# Altium footprint library Rez-Axial Pot.PcbLib: 113 footprints (part 7 of 8)
Each footprint in its own frame and in the unit in brackets; x right, y up, seen from the top. Pads: shape width x height; smd on the part's side, far side on the other; paste and mask are expansions set on the pad; w line width, h text height; cw(c..) or ccw(c..) is an arc to the next point about the centre after c.
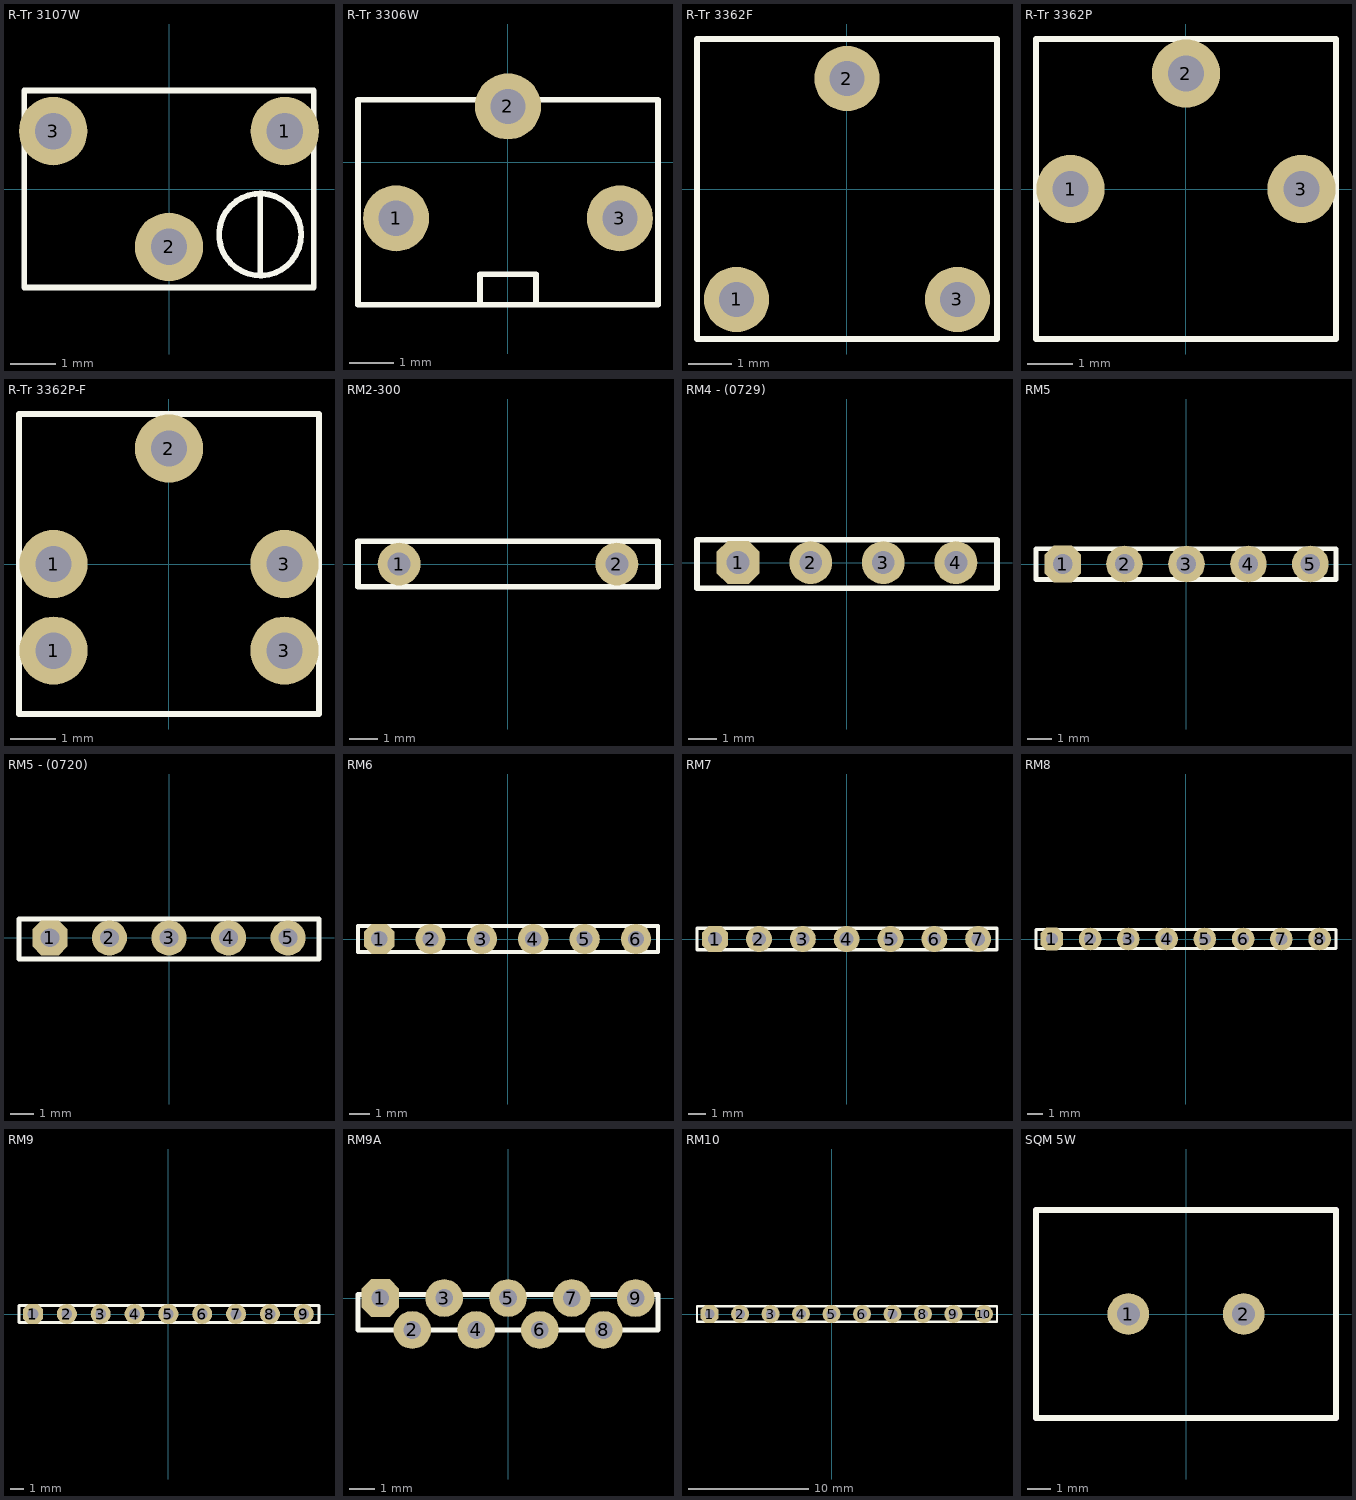
[diagram p6: the footprints below, top view; thin cyan lines are the x and y axes]

## R-Tr 3107W [mm]
pads (3):
  round 1.5 hole 0.8: 1(2.54,1.27) 2(0,-1.27) 3(-2.54,1.27)
TopOverlay:
  circle w0.127: c2,-1 r0.9
  lines w0.127: 2,-1.9 2,-0.1 ; -3.175,-2.16 -3.175,2.16 3.175,2.16 3.175,-2.16 -3.175,-2.16
3D body "Rp-3107W.STEP": height 7.7, standoff -2.5, extent -3.175,-2.16 3.175,2.16

## R-Tr 3306W [mm]
pads (3):
  round 1.5 hole 0.8: 1(-2.54,-1.27) 2(0,1.27) 3(2.54,-1.27)
TopOverlay:
  lines w0.127: -0.635,-3.175 -0.635,-2.54 0.635,-2.54 0.635,-3.175 ; -3.405,-3.23 -3.405,1.42 3.405,1.42 3.405,-3.23 -3.405,-3.23
3D body "Rp-3306W.STEP": height 8.4, standoff -1.91, extent -3.405,-3.23 3.405,1.42

## R-Tr 3362F [mm]
pads (3):
  round 1.5 hole 0.8: 1(-2.54,-2.54) 2(0,2.54) 3(2.54,-2.54)
TopOverlay:
  lines w0.127: -3.45,-3.45 -3.45,3.45 3.45,3.45 3.45,-3.45 -3.45,-3.45
3D body "Rp-3362F.STEP": height 5.2, standoff -2.5, extent -3.45,-3.45 3.45,3.45

## R-Tr 3362P [mm]
pads (3):
  round 1.5 hole 0.8: 1(-2.54,0) 2(0,2.54) 3(2.54,0)
TopOverlay:
  lines w0.127: -3.3,-3.3 3.3,-3.3 3.3,3.3 -3.3,3.3 -3.3,-3.3
3D body "Rp-3362P-1-102LF.STEP": height 4.4, standoff -3, extent -3.3,-3.3 3.3,3.3

## R-Tr 3362P-F [mm]
pads (5):
  round 1.5 hole 0.8: 1(-2.54,-1.905) 1(-2.54,0) 2(0,2.54) 3(2.54,-1.905) 3(2.54,0)
TopOverlay:
  lines w0.127: -3.3,-3.3 3.3,-3.3 3.3,3.3 -3.3,3.3 -3.3,-3.3
3D body "Rp-3362P-1-102LF.STEP": height 4.4, standoff -3, extent -3.3,-3.3 3.3,3.3

## RM2-300 [mm]
pads (2):
  round 1.5 hole 0.8: 1(-3.81,0) 2(3.81,0)
TopOverlay:
  lines w0.2: -5.25,-0.8 5.25,-0.8 5.25,0.8 -5.25,0.8 -5.25,-0.8
3D body "RM2-300.STEP": height 3.5, standoff -7.55, extent -5.25,-0.8 5.25,0.8

## RM4 - (0729) [mm]
pads (4):
  oct 1.5x1.5 hole 0.8: 1(-3.81,0)
  round 1.5 hole 0.8: 2(-1.27,0) 3(1.27,0) 4(3.81,0)
TopOverlay:
  lines w0.2: -5.25,-0.9 -5.25,0.8 5.25,0.8 5.25,-0.9 -5.25,-0.9
3D body "RM-4 (0729).STEP": height 9.48, standoff -2.5, extent -5.25,-0.9 5.25,0.8

## RM5 [mm]
pads (5):
  oct 1.5x1.5 hole 0.8: 1(-5.08,0)
  round 1.5 hole 0.8: 2(-2.54,0) 3(0,0) 4(2.54,0) 5(5.08,0)
TopOverlay:
  lines w0.2: -6.17,-0.635 6.13,-0.635 6.13,0.625 -6.17,0.625 -6.17,-0.635
3D body "RM-5.STEP": height 11, standoff -3.2, extent -6.17,-0.625 6.13,0.625

## RM5 - (0720) [mm]
pads (5):
  oct 1.5x1.5 hole 0.8: 1(-5.08,0)
  round 1.5 hole 0.8: 2(-2.54,0) 3(0,0) 4(2.54,0) 5(5.08,0)
TopOverlay:
  lines w0.2: -6.4,-0.9 6.4,-0.9 6.4,0.8 -6.4,0.8 -6.4,-0.9
3D body "RM-5 (0720).STEP": height 10.62, standoff -2.5, extent -6.4,-0.9 6.4,0.8

## RM6 [mm]
pads (6):
  oct 1.5x1.5 hole 0.8: 1(-6.35,0)
  round 1.5 hole 0.8: 2(-3.81,0) 3(-1.27,0) 4(1.27,0) 5(3.81,0) 6(6.35,0)
TopOverlay:
  lines w0.2: -7.4,-0.635 7.44,-0.635 7.44,0.635 -7.4,0.635 -7.4,-0.635
3D body "RM-6.STEP": height 4.8, standoff -3.2, extent -7.4,-0.625 7.44,0.625

## RM7 [mm]
pads (7):
  oct 1.5x1.5 hole 0.8: 1(-7.62,0)
  round 1.5 hole 0.8: 2(-5.08,0) 3(-2.54,0) 4(0,0) 5(2.54,0) 6(5.08,0) 7(7.62,0)
TopOverlay:
  lines w0.2: -8.67,-0.635 8.71,-0.635 8.71,0.625 -8.67,0.625 -8.67,-0.635
3D body "RM-7.STEP": height 4.8, standoff -3.2, extent -8.67,-0.625 8.71,0.625

## RM8 [mm]
pads (8):
  oct 1.5x1.5 hole 0.8: 1(-8.89,0)
  round 1.5 hole 0.8: 2(-6.35,0) 3(-3.81,0) 4(-1.27,0) 5(1.27,0) 6(3.81,0) 7(6.35,0) 8(8.89,0)
TopOverlay:
  lines w0.2: -9.94,-0.635 -9.94,0.635 9.98,0.635 9.98,-0.635 -9.94,-0.635
3D body "RM-8.STEP": height 5.8, standoff -2.2, extent -9.94,-0.625 9.98,0.625

## RM9 [mm]
pads (9):
  oct 1.5x1.5 hole 0.8: 1(-10.16,0)
  round 1.5 hole 0.8: 2(-7.62,0) 3(-5.08,0) 4(-2.54,0) 5(0,0) 6(2.54,0) 7(5.08,0) 8(7.62,0) 9(10.16,0)
TopOverlay:
  lines w0.2: -11.21,-0.635 11.303,-0.635 11.303,0.635 -11.21,0.635 -11.21,-0.635
3D body "RN-9-Pins-0.125W-SIP.STEP": height 6.3, standoff -2.2, extent -11.21,-0.625 11.29,0.625

## RM9A [mm]
pads (9):
  oct 1.5x1.5 hole 0.7: 1(-5.08,0)
  round 1.5 hole 0.7: 2(-3.81,-1.27) 3(-2.54,0) 4(-1.27,-1.27) 5(0,0) 6(1.27,-1.27) 7(2.54,0) 8(3.81,-1.27) 9(5.08,0)
TopOverlay:
  lines w0.2: -5.969,-1.27 -5.969,0.15 5.969,0.15 5.969,-1.27 -5.969,-1.27
3D body "RM-7 (0733).STEP": height 13, standoff -2.5, extent -6,-1.37 6,0.15

## RM10 [mm]
pads (10):
  oct 1.5x1.5 hole 0.8: 1(-10.16,0)
  round 1.5 hole 0.8: 2(-7.62,0) 3(-5.08,0) 4(-2.54,0) 5(0,0) 6(2.54,0) 7(5.08,0) 8(7.62,0) 9(10.16,0) 10(12.7,0)
TopOverlay:
  lines w0.2: -11.21,-0.635 -11.21,0.635 13.79,0.635 13.79,-0.635 -11.21,-0.635
3D body "RM-10pin 0.125W 2.54.STEP": height 6.3, standoff -2.2, extent -11.21,-0.625 13.79,0.625

## SQM 5W [mm]
pads (2):
  round 1.8 hole 1: 1(-2.5,0) 2(2.5,0)
TopOverlay:
  lines w0.254: -6.5,-4.5 -6.5,4.5 6.5,4.5 6.5,-4.5 -6.5,-4.5
Mechanical3:
  text ".Designator / .Comment" at -1.905,1.27 h1.02
Mechanical13:
  lines w0.254: -6.5,-4.5 -6.5,4.5 6.5,4.5 6.5,-4.5 -6.5,-4.5
3D body "User Library-Cement Power Resistor SQM-05 5W 15K.step": height 25, standoff -5, extent -6.25,-4.4 6.25,4.6